# Altium footprint library PERCRO_footprints.PcbLib: 177 footprints (part 10 of 12)
Each footprint in its own frame and in the unit in brackets; x right, y up, seen from the top. Pads: shape width x height; smd on the part's side, far side on the other; paste and mask are expansions set on the pad; w line width, h text height; cw(c..) or ccw(c..) is an arc to the next point about the centre after c.
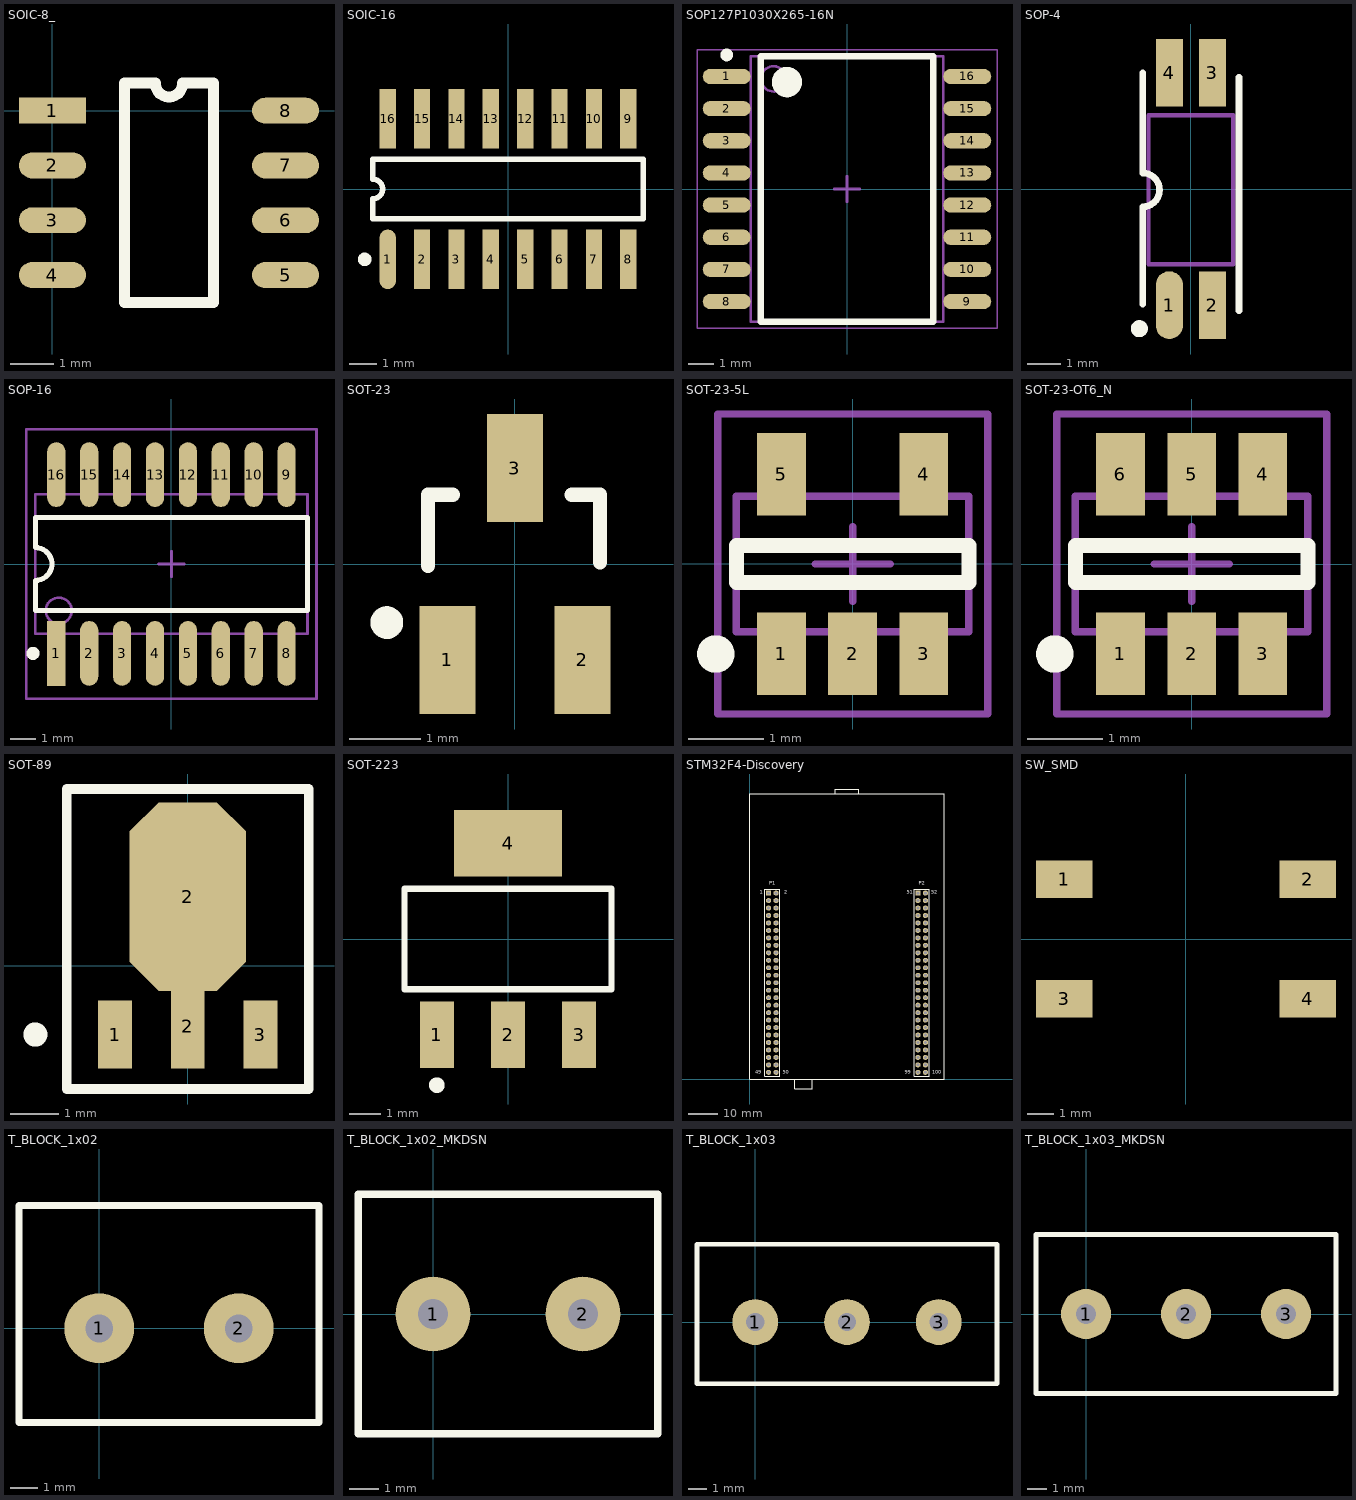
[diagram p9: the footprints below, top view; thin cyan lines are the x and y axes]

## SOIC-8_ [mm]
pads (8):
  rect 1.55x0.6 smd: 1(0,0)
  oval 1.55x0.6 smd: 2(0,-1.27) 3(0,-2.54) 4(0,-3.81) 5(5.4,-3.81) 6(5.4,-2.54) 7(5.4,-1.27) 8(5.4,0)
Top Overlay:
  lines w0.254: 1.664,-4.445 1.664,0.635 2.382,0.635 ccw(c2.7,0.635) 3.017,0.635 3.736,0.635 3.736,-4.445 1.664,-4.445

## SOIC-16 [mm]
pads (16):
  oval 0.6x2.2 smd: 1(-4.445,-2.6)
  rect 0.6x2.2 smd: 2(-3.175,-2.6) 3(-1.905,-2.6) 4(-0.635,-2.6) 5(0.635,-2.6) 6(1.905,-2.6) 7(3.175,-2.6) 8(4.445,-2.6) 9(4.445,2.6) 10(3.175,2.6) 11(1.905,2.6) 12(0.635,2.6) 13(-0.635,2.6) 14(-1.905,2.6) 15(-3.175,2.6) 16(-4.445,2.6)
Top Overlay:
  circle w0.254: c-5.295,-2.6 r0.125
  lines w0.2: -5,-1.1 5,-1.1 5,1.1 -5,1.1 -5,0.367 cw(c-5,0) -5,-0.367 -5,-1.1
3D body "SOIC-16.step": height 1.4, standoff 0, extent -4.95,-3 4.95,3

## SOP127P1030X265-16N [mm] "SOP, 16-Leads, Body 10.25x7.50mm, Pitch 1.27mm, IPC Medium Density"
height 2.65
pads (16):
  oval 1.9x0.6 smd: 1(-4.75,4.445) 2(-4.75,3.175) 3(-4.75,1.905) 4(-4.75,0.635) 5(-4.75,-0.635) 6(-4.75,-1.905) 7(-4.75,-3.175) 8(-4.75,-4.445) 9(4.75,-4.445) 10(4.75,-3.175) 11(4.75,-1.905) 12(4.75,-0.635) 13(4.75,0.635) 14(4.75,1.905) 15(4.75,3.175) 16(4.75,4.445)
Top Overlay:
  circle w0.25: c-4.75,5.295 r0.125
  circle w0.6: c-2.373,4.223 r0.3
  lines w0.254: -3.4,-5.25 -3.4,5.25 3.4,5.25 3.4,-5.25 -3.4,-5.25
Mechanical 13:
  circle w0.1: c-2.9,4.35 r0.5
  lines w0.1: -3.8,-5.25 -3.8,5.25 3.8,5.25 3.8,-5.25 -3.8,-5.25
Mechanical 15:
  lines w0.05: -5.925,-5.5 -5.925,5.5 5.925,5.5 5.925,-5.5 -5.925,-5.5
  lines w0.1: -0.5,0 0.5,0 ; 0,-0.5 0,0.5
3D body: height 2.65, standoff 0.1, extent -3.8,-5.25 3.8,5.25

## SOP-4 [mm] "Opto-isolator"
pads (4):
  oval 0.8x2 smd: 1(-0.635,-3.429)
  rect 0.8x2 smd: 2(0.635,-3.429) 3(0.635,3.429) 4(-0.635,3.429)
Top Overlay:
  circle w0.254: c-1.523,-4.125 r0.125
  lines w0.2: -1.422,-3.399 -1.422,-0.525 ccw(c-1.423,-0.025) -1.422,0.475 -1.422,3.424 ; 1.422,-3.596 1.422,3.302
Mechanical 13:
  lines w0.127: -1.25,-2.225 -1.25,2.175 1.25,2.175 1.25,-2.225 -1.25,-2.225
3D body "SOP-4.STEP": height 2, standoff 0, extent -1.245,-3.523 1.245,3.477

## SOP-16 [mm]
pads (16):
  rect 0.7x2.5 smd: 1(-4.445,-3.45)
  oval 0.7x2.5 smd: 2(-3.175,-3.45) 3(-1.905,-3.45) 4(-0.635,-3.45) 5(0.635,-3.45) 6(1.905,-3.45) 7(3.175,-3.45) 8(4.445,-3.45) 9(4.445,3.45) 10(3.175,3.45) 11(1.905,3.45) 12(0.635,3.45) 13(-0.635,3.45) 14(-1.905,3.45) 15(-3.175,3.45) 16(-4.445,3.45)
Top Overlay:
  circle w0.254: c-5.345,-3.45 r0.125
  lines w0.2: -5.25,-1.8 5.25,-1.8 5.25,1.8 -5.25,1.8 -5.25,0.635 cw(c-5.25,0) -5.25,-0.635 -5.25,-1.8
Mechanical 13:
  circle w0.1: c-4.35,-1.8 r0.5
  lines w0.1: -5.25,-2.7 -5.25,2.7 5.25,2.7 5.25,-2.7 -5.25,-2.7
Mechanical 15:
  lines w0.1: -0.5,0 0.5,0 ; 0,-0.5 0,0.5 ; -5.6,-5.2 -5.6,5.2 5.6,5.2 5.6,-5.2 -5.6,-5.2
3D body "SOP-16.STEP": height 2, standoff 0, extent -5.15,-3.5 5.15,3.5

## SOT-23 [mm]
pads (3):
  rect 0.787x1.524 smd: 1(-0.95,-1.35) 2(0.95,-1.35) 3(0,1.35)
Top Overlay:
  circle w0.254: c-1.803,-0.825 r0.103
  lines w0.2: -1.225,-0.025 -1.225,0.975 -0.875,0.975 ; 0.8,0.975 1.2,0.975 1.2,0.025
3D body "SOT-23.STEP": height 1.1, standoff 0, extent -1.5,-1.245 1.5,1.255

## SOT-23-5L [mm]
pads (5):
  rect 0.65x1.1 smd: 1(-0.95,-1.2) 2(0,-1.2) 3(0.95,-1.2) 4(0.95,1.2) 5(-0.95,1.2)
Top Overlay:
  circle w0.25: c-1.825,-1.2 r0.125
  lines w0.2: -1.55,-0.25 -1.55,0.25 1.55,0.25 1.55,-0.25 -1.55,-0.25
Mechanical 13:
  lines w0.1: -1.55,-0.9 1.55,-0.9 1.55,0.9 -1.55,0.9 -1.55,-0.9
Mechanical 15:
  lines w0.1: -0.5,0 0.5,0 ; 0,-0.5 0,0.5 ; -1.8,-2 1.8,-2 1.8,2 -1.8,2 -1.8,-2
3D body: height 1.45, standoff 0, extent -1.55,-0.9 1.55,0.9

## SOT-23-OT6_N [mm]
pads (6):
  rect 0.65x1.1 smd: 1(-0.95,-1.2) 2(0,-1.2) 3(0.95,-1.2) 4(0.95,1.2) 5(0,1.2) 6(-0.95,1.2)
Top Overlay:
  circle w0.25: c-1.825,-1.2 r0.125
  lines w0.2: -1.55,-0.25 1.55,-0.25 1.55,0.25 -1.55,0.25 -1.55,-0.25
Mechanical 13:
  lines w0.1: -1.55,-0.9 1.55,-0.9 1.55,0.9 -1.55,0.9 -1.55,-0.9
Mechanical 15:
  lines w0.1: -0.5,0 0.5,0 ; 0,-0.5 0,0.5 ; -1.8,-2 1.8,-2 1.8,2 -1.8,2 -1.8,-2
3D body: height 1.45, standoff 0, extent -1.55,-0.9 1.55,0.9

## SOT-89 [mm]
pads (4):
  rect 0.7x1.4 smd: 1(-1.5,-1.425) 3(1.5,-1.425)
  rect 0.7x1.75 smd: 2(0,-1.25)
  oct 2.4x3.9 smd: 2(0,1.425)
Top Overlay:
  circle w0.25: c-3.15,-1.425 r0.125
  lines w0.2: -2.5,-2.55 2.5,-2.55 2.5,3.65 -2.5,3.65 -2.5,-2.55
3D body "SOT-89.step": height 1.4, standoff 0, extent -2.24,-1.78 2.26,2.155

## SOT-223 [mm]
pads (4):
  rect 1.1x2.15 smd: 1(-2.3,-3.1) 2(0,-3.1) 3(2.3,-3.1)
  rect 3.5x2.15 smd: 4(0,3.1)
Top Overlay:
  circle w0.254: c-2.3,-4.725 r0.125
  lines w0.2: -3.35,-1.625 -3.35,1.625 3.35,1.625 3.35,-1.625 -3.35,-1.625
3D body "SOT-223.step": height 1.65, standoff 0, extent -3.25,-3.5 3.25,3.5

## STM32F4-Discovery [mm] "Footprint of STM32F4 target"
pads (100):
  rect 1.778x1.651 hole 0.9: 1(6.33,63.26) 51(57.13,63.26)
  oval 1.778x1.651 hole 0.9: 2(8.87,63.26) 3(6.33,60.72) 4(8.87,60.72) 5(6.33,58.18) 6(8.87,58.18) 7(6.33,55.64) 8(8.87,55.64) 9(6.33,53.1) 10(8.87,53.1) 11(6.33,50.56) 12(8.87,50.56) 13(6.33,48.02) 14(8.87,48.02) 15(6.33,45.48) 16(8.87,45.48) 17(6.33,42.94) 18(8.87,42.94) 19(6.33,40.4) 20(8.87,40.4) 21(6.33,37.86) 22(8.87,37.86) 23(6.33,35.32) 24(8.87,35.32) 25(6.33,32.78) 26(8.87,32.78) 27(6.33,30.24) 28(8.87,30.24) 29(6.33,27.7) 30(8.87,27.7) 31(6.33,25.16) 32(8.87,25.16) 33(6.33,22.62) 34(8.87,22.62) 35(6.33,20.08) 36(8.87,20.08) 37(6.33,17.54) 38(8.87,17.54) 39(6.33,15) 40(8.87,15) 41(6.33,12.46) 42(8.87,12.46) 43(6.33,9.92) 44(8.87,9.92) 45(6.33,7.38) 46(8.87,7.38) 47(6.33,4.84) 48(8.87,4.84) 49(6.33,2.3) 50(8.87,2.3) 52(59.67,63.26) 53(57.13,60.72) 54(59.67,60.72) 55(57.13,58.18) 56(59.67,58.18) 57(57.13,55.64) 58(59.67,55.64) 59(57.13,53.1) 60(59.67,53.1) 61(57.13,50.56) 62(59.67,50.56) 63(57.13,48.02) 64(59.67,48.02) 65(57.13,45.48) 66(59.67,45.48) 67(57.13,42.94) 68(59.67,42.94) 69(57.13,40.4) 70(59.67,40.4) 71(57.13,37.86) 72(59.67,37.86) 73(57.13,35.32) 74(59.67,35.32) 75(57.13,32.78) 76(59.67,32.78) 77(57.13,30.24) 78(59.67,30.24) 79(57.13,27.7) 80(59.67,27.7) 81(57.13,25.16) 82(59.67,25.16) 83(57.13,22.62) 84(59.67,22.62) 85(57.13,20.08) 86(59.67,20.08) 87(57.13,17.54) 88(59.67,17.54) 89(57.13,15) 90(59.67,15) 91(57.13,12.46) 92(59.67,12.46) 93(57.13,9.92) 94(59.67,9.92) 95(57.13,7.38) 96(59.67,7.38) 97(57.13,4.84) 98(59.67,4.84) 99(57.13,2.3) 100(59.67,2.3)
Top Overlay:
  lines w0.2: 5.06,1.03 10.14,1.03 10.14,64.53 5.06,64.53 5.06,1.03 ; 55.86,1.03 60.94,1.03 60.94,64.53 55.86,64.53 55.86,1.03
  lines w0.254: 15.152,0 15.152,-3.35 21.152,-3.35 21.152,0 ; 29,97 29,98.65 33,98.65 37,98.65 37,97 ; 0,0 66,0 66,97 0,97 0,0
  text "P2" at 57.404,66.04 h1.27
  text "P1" at 6.604,66.04 h1.27
  text "2" at 11.684,62.992 h1.27
  text "1" at 3.302,62.992 h1.27
  text "49" at 1.778,1.778 h1.27
  text "50" at 11.176,1.778 h1.27
  text "52" at 61.722,62.992 h1.27
  text "51" at 53.34,62.992 h1.27
  text "99" at 52.578,1.778 h1.27
  text "100" at 61.976,1.778 h1.27
3D body "female_header_a-bl254-dg-g50d.stp": height 8.5, standoff -3.2, extent 55.9,0.905 60.9,64.655
3D body "female_header_a-bl254-dg-g50d.stp": height 8.5, standoff -3.2, extent 5.1,0.905 10.1,64.655

## SW_SMD [mm] "FSM4JSMA"
pads (4):
  rect 2.1x1.4 smd: 1(-4.55,2.23) 2(4.55,2.23) 3(-4.55,-2.23) 4(4.55,-2.23)
3D body "SW-SMD.step": height 5.53, standoff 0, extent -5.017,-3.172 5.017,3.172

## T_BLOCK_1x02 [mil]
pads (2):
  round 100 hole 40: 1(0,0) 2(200,0)
Top Overlay:
  lines w10: -115,-135 50,-135 243.75,-135 315,-135 315,176 -115,176 -115,-135
3D body "T_block 2 POS.STEP": height 393.7, standoff -120, extent -100,-124.92 300,170.35

## T_BLOCK_1x02_MKDSN [mil]
pads (2):
  round 100 hole 40: 1(0,0) 2(200,0)
Top Overlay:
  lines w10: -100,-159.45 -100,159.45 300,159.45 300,-159.45 -100,-159.45
3D body "T_block 2 POS.STEP": height 393.7, standoff -120, extent -100,-124.92 300,170.35

## T_BLOCK_1x03 [mil] "Terminal block 1x03"
pads (3):
  round 100 hole 40: 1(0,0) 2(200,0) 3(400,0)
Top Overlay:
  lines w10: -127,-135 50,-135 243.75,-135 527,-135 527,170 -127,170 -127,-135
3D body "TB_1x03.stp": height 391.73, standoff -133.86, extent -123.61,-129.91 522.06,165.37

## T_BLOCK_1x03_MKDSN [mil] "Terminal block 1x03"
pads (3):
  round 100 hole 40: 1(0,0) 2(200,0) 3(400,0)
Top Overlay:
  lines w10: -100,-159.45 500,-159.45 500,159.45 -100,159.45 -100,-159.45
3D body "TB_1x03.stp": height 391.73, standoff -133.86, extent -123.61,-129.91 522.06,165.37